# Altium footprint library con-samtec.PCBLIB: 805 footprints (part 9 of 55)
Each footprint in its own frame and in the unit in brackets; x right, y up, seen from the top. Pads: shape width x height; smd on the part's side, far side on the other; paste and mask are expansions set on the pad; w line width, h text height; cw(c..) or ccw(c..) is an arc to the next point about the centre after c.
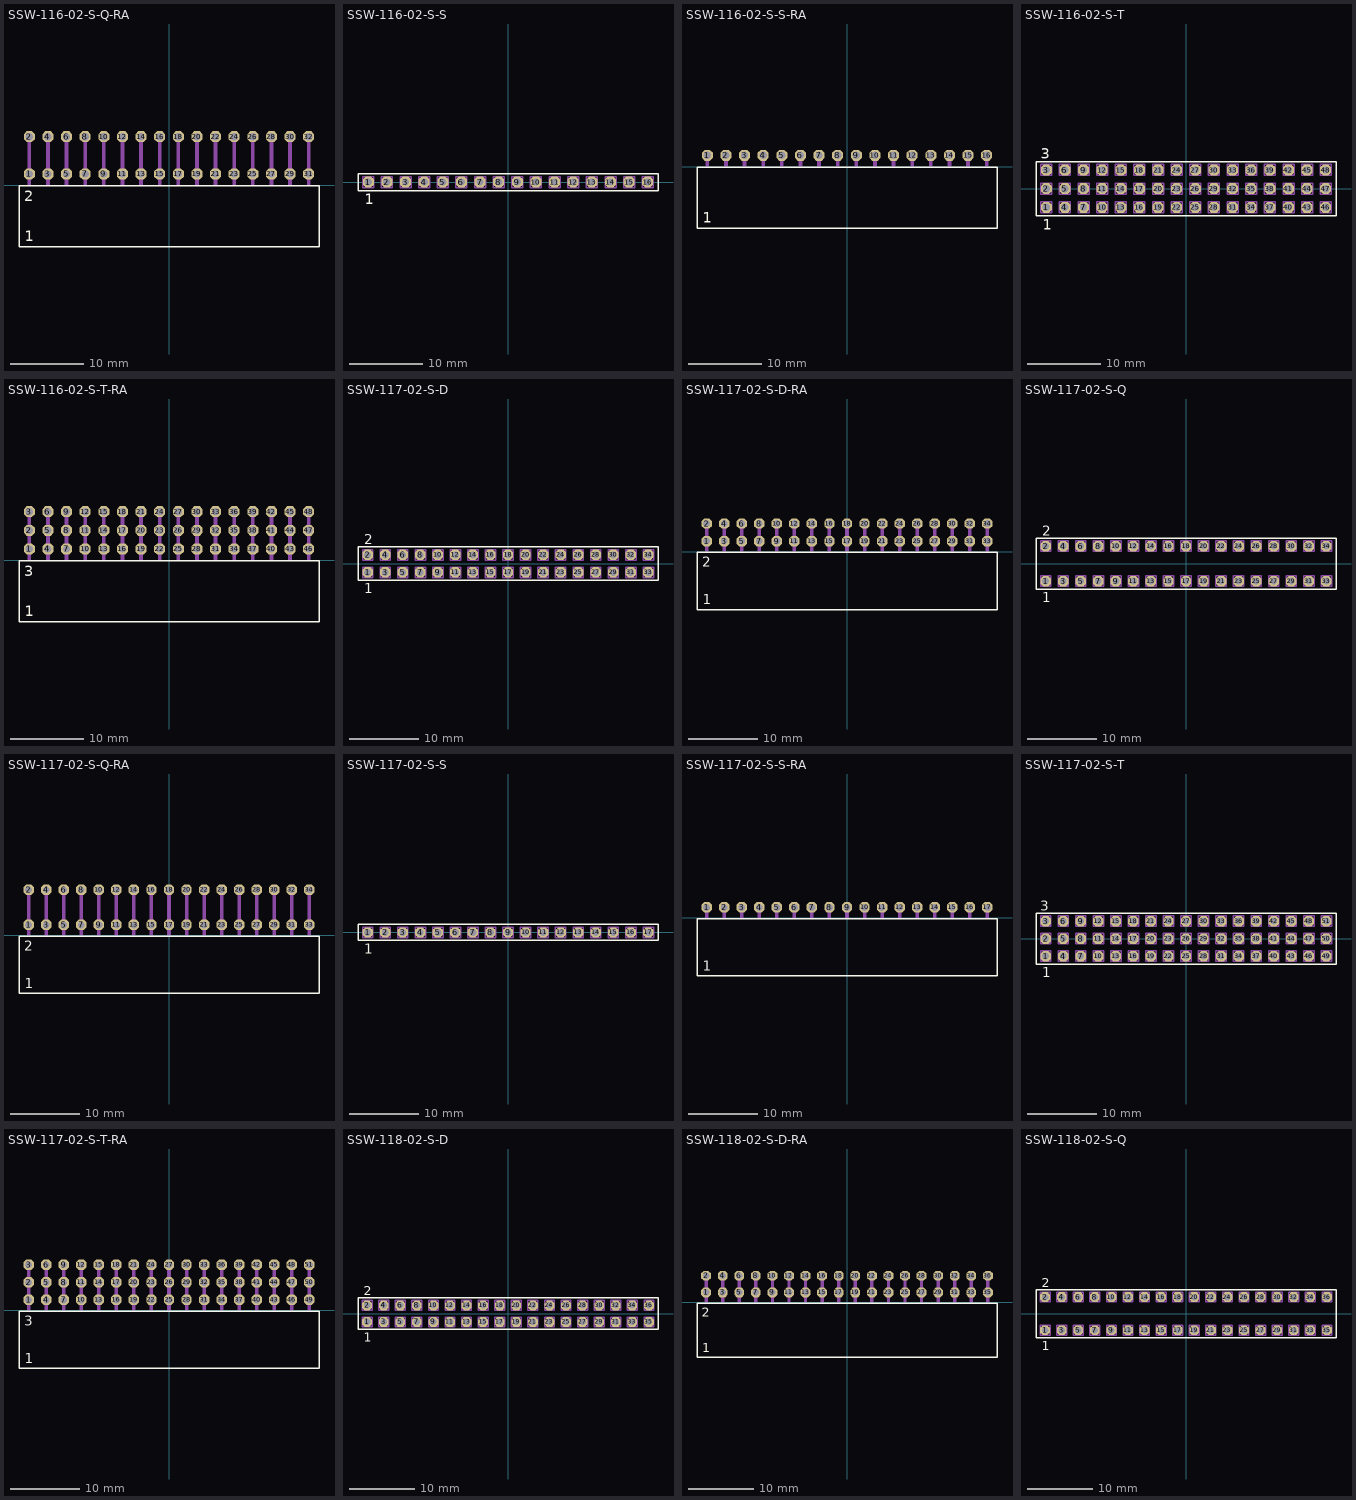
[diagram p8: the footprints below, top view; thin cyan lines are the x and y axes]

## SSW-116-02-S-Q-RA [mil]
pads (32):
  oct 59.06x59.06 hole 39.37: 1(-750,60) 2(-750,260) 3(-650,60) 4(-650,260) 5(-550,60) 6(-550,260) 7(-450,60) 8(-450,260) 9(-350,60) 10(-350,260) 11(-250,60) 12(-250,260) 13(-150,60) 14(-150,260) 15(-50,60) 16(-50,260) 17(50,60) 18(50,260) 19(150,60) 20(150,260) 21(250,60) 22(250,260) 23(350,60) 24(350,260) 25(450,60) 26(450,260) 27(550,60) 28(550,260) 29(650,60) 30(650,260) 31(750,60) 32(750,260)
Top Overlay:
  lines w8: -805.08,-330.55 805.08,-330.55 805.08,-4.17 -805.08,-4.17 -805.08,-330.55
  text "1" at -773.43,-301.18 h56.1
  text "2" at -776.38,-86.61 h56.1
Mechanical 16:
  rectangle: -760,0 -740,270
  rectangle: -660,0 -640,270
  rectangle: -560,0 -540,270
  rectangle: -460,0 -440,270
  rectangle: -360,0 -340,270
  rectangle: -260,0 -240,270
  rectangle: -160,0 -140,270
  rectangle: -60,0 -40,270
  rectangle: 40,0 60,270
  rectangle: 140,0 160,270
  rectangle: 240,0 260,270
  rectangle: 340,0 360,270
  rectangle: 440,0 460,270
  rectangle: 540,0 560,270
  rectangle: 640,0 660,270
  rectangle: 740,0 760,270

## SSW-116-02-S-S [mm]
pads (16):
  oct 1.5x1.5 hole 1: 1(-19.05,0) 2(-16.51,0) 3(-13.97,0) 4(-11.43,0) 5(-8.89,0) 6(-6.35,0) 7(-3.81,0) 8(-1.27,0) 9(1.27,0) 10(3.81,0) 11(6.35,0) 12(8.89,0) 13(11.43,0) 14(13.97,0) 15(16.51,0) 16(19.05,0)
Top Overlay:
  lines w0.203: -20.449,-1.155 20.449,-1.155 20.449,1.155 -20.449,1.155 -20.449,-1.155
  text "1" at -19.558,-3.048 h1.42
Mechanical 16:
  lines w0.203: -19.795,-0.745 -18.295,-0.745 -18.295,0.755 -19.795,0.755 -19.795,-0.745 ; -17.255,-0.745 -15.755,-0.745 -15.755,0.755 -17.255,0.755 -17.255,-0.745 ; -14.715,-0.745 -13.215,-0.745 -13.215,0.755 -14.715,0.755 -14.715,-0.745 ; -12.175,-0.745 -10.675,-0.745 -10.675,0.755 -12.175,0.755 -12.175,-0.745 ; -9.635,-0.745 -8.135,-0.745 -8.135,0.755 -9.635,0.755 -9.635,-0.745 ; -7.095,-0.745 -5.595,-0.745 -5.595,0.755 -7.095,0.755 -7.095,-0.745 ; -4.555,-0.745 -3.055,-0.745 -3.055,0.755 -4.555,0.755 -4.555,-0.745 ; -2.015,-0.745 -0.515,-0.745 -0.515,0.755 -2.015,0.755 -2.015,-0.745 ; 0.525,-0.745 2.025,-0.745 2.025,0.755 0.525,0.755 0.525,-0.745 ; 3.065,-0.745 4.565,-0.745 4.565,0.755 3.065,0.755 3.065,-0.745 ; 5.605,-0.745 7.105,-0.745 7.105,0.755 5.605,0.755 5.605,-0.745 ; 8.145,-0.745 9.645,-0.745 9.645,0.755 8.145,0.755 8.145,-0.745 ; 10.685,-0.745 12.185,-0.745 12.185,0.755 10.685,0.755 10.685,-0.745 ; 13.225,-0.745 14.725,-0.745 14.725,0.755 13.225,0.755 13.225,-0.745 ; 15.765,-0.745 17.265,-0.745 17.265,0.755 15.765,0.755 15.765,-0.745 ; 18.305,-0.745 19.805,-0.745 19.805,0.755 18.305,0.755 18.305,-0.745

## SSW-116-02-S-S-RA [mil]
pads (16):
  oct 59.06x59.06 hole 39.37: 1(-750,60) 2(-650,60) 3(-550,60) 4(-450,60) 5(-350,60) 6(-250,60) 7(-150,60) 8(-50,60) 9(50,60) 10(150,60) 11(250,60) 12(350,60) 13(450,60) 14(550,60) 15(650,60) 16(750,60)
Top Overlay:
  lines w8: -805.08,-330.55 805.08,-330.55 805.08,-4.17 -805.08,-4.17 -805.08,-330.55
  text "1" at -773.43,-301.18 h56.1
Mechanical 16:
  rectangle: -760,0 -740,70
  rectangle: -660,0 -640,70
  rectangle: -560,0 -540,70
  rectangle: -460,0 -440,70
  rectangle: -360,0 -340,70
  rectangle: -260,0 -240,70
  rectangle: -160,0 -140,70
  rectangle: -60,0 -40,70
  rectangle: 40,0 60,70
  rectangle: 140,0 160,70
  rectangle: 240,0 260,70
  rectangle: 340,0 360,70
  rectangle: 440,0 460,70
  rectangle: 540,0 560,70
  rectangle: 640,0 660,70
  rectangle: 740,0 760,70

## SSW-116-02-S-T [mm]
pads (48):
  oct 1.5x1.5 hole 1: 1(-19.05,-2.54) 2(-19.05,0) 3(-19.05,2.54) 4(-16.51,-2.54) 5(-16.51,0) 6(-16.51,2.54) 7(-13.97,-2.54) 8(-13.97,0) 9(-13.97,2.54) 10(-11.43,-2.54) 11(-11.43,0) 12(-11.43,2.54) 13(-8.89,-2.54) 14(-8.89,0) 15(-8.89,2.54) 16(-6.35,-2.54) 17(-6.35,0) 18(-6.35,2.54) 19(-3.81,-2.54) 20(-3.81,0) 21(-3.81,2.54) 22(-1.27,-2.54) 23(-1.27,0) 24(-1.27,2.54) 25(1.27,-2.54) 26(1.27,0) 27(1.27,2.54) 28(3.81,-2.54) 29(3.81,0) 30(3.81,2.54) 31(6.35,-2.54) 32(6.35,0) 33(6.35,2.54) 34(8.89,-2.54) 35(8.89,0) 36(8.89,2.54) 37(11.43,-2.54) 38(11.43,0) 39(11.43,2.54) 40(13.97,-2.54) 41(13.97,0) 42(13.97,2.54) 43(16.51,-2.54) 44(16.51,0) 45(16.51,2.54) 46(19.05,-2.54) 47(19.05,0) 48(19.05,2.54)
Top Overlay:
  lines w0.203: -20.449,-3.695 20.449,-3.695 20.449,3.695 -20.449,3.695 -20.449,-3.695
  text "1" at -19.558,-5.588 h1.42
  text "3" at -19.812,4.064 h1.42
Mechanical 16:
  drawing of 192 lines, arcs and shapes, not listed

## SSW-116-02-S-T-RA [mil]
pads (48):
  oct 59.06x59.06 hole 39.37: 1(-750,60) 2(-750,160) 3(-750,260) 4(-650,60) 5(-650,160) 6(-650,260) 7(-550,60) 8(-550,160) 9(-550,260) 10(-450,60) 11(-450,160) 12(-450,260) 13(-350,60) 14(-350,160) 15(-350,260) 16(-250,60) 17(-250,160) 18(-250,260) 19(-150,60) 20(-150,160) 21(-150,260) 22(-50,60) 23(-50,160) 24(-50,260) 25(50,60) 26(50,160) 27(50,260) 28(150,60) 29(150,160) 30(150,260) 31(250,60) 32(250,160) 33(250,260) 34(350,60) 35(350,160) 36(350,260) 37(450,60) 38(450,160) 39(450,260) 40(550,60) 41(550,160) 42(550,260) 43(650,60) 44(650,160) 45(650,260) 46(750,60) 47(750,160) 48(750,260)
Top Overlay:
  lines w8: -805.08,-330.55 805.08,-330.55 805.08,-4.17 -805.08,-4.17 -805.08,-330.55
  text "1" at -773.43,-301.18 h56.1
  text "3" at -776.38,-86.61 h56.1
Mechanical 16:
  rectangle: -760,0 -740,270
  rectangle: -660,0 -640,270
  rectangle: -560,0 -540,270
  rectangle: -460,0 -440,270
  rectangle: -360,0 -340,270
  rectangle: -260,0 -240,270
  rectangle: -160,0 -140,270
  rectangle: -60,0 -40,270
  rectangle: 40,0 60,270
  rectangle: 140,0 160,270
  rectangle: 240,0 260,270
  rectangle: 340,0 360,270
  rectangle: 440,0 460,270
  rectangle: 540,0 560,270
  rectangle: 640,0 660,270
  rectangle: 740,0 760,270

## SSW-117-02-S-D [mm]
pads (34):
  oct 1.5x1.5 hole 1: 1(-20.32,-1.27) 2(-20.32,1.27) 3(-17.78,-1.27) 4(-17.78,1.27) 5(-15.24,-1.27) 6(-15.24,1.27) 7(-12.7,-1.27) 8(-12.7,1.27) 9(-10.16,-1.27) 10(-10.16,1.27) 11(-7.62,-1.27) 12(-7.62,1.27) 13(-5.08,-1.27) 14(-5.08,1.27) 15(-2.54,-1.27) 16(-2.54,1.27) 17(0,-1.27) 18(0,1.27) 19(2.54,-1.27) 20(2.54,1.27) 21(5.08,-1.27) 22(5.08,1.27) 23(7.62,-1.27) 24(7.62,1.27) 25(10.16,-1.27) 26(10.16,1.27) 27(12.7,-1.27) 28(12.7,1.27) 29(15.24,-1.27) 30(15.24,1.27) 31(17.78,-1.27) 32(17.78,1.27) 33(20.32,-1.27) 34(20.32,1.27)
Top Overlay:
  lines w0.203: -21.719,-2.425 21.719,-2.425 21.719,2.425 -21.719,2.425 -21.719,-2.425
  text "1" at -20.828,-4.318 h1.42
  text "2" at -20.828,2.794 h1.42
Mechanical 16:
  lines w0.203: -21.065,-2.015 -19.565,-2.015 -19.565,-0.515 -21.065,-0.515 -21.065,-2.015 ; -21.065,0.525 -19.565,0.525 -19.565,2.025 -21.065,2.025 -21.065,0.525 ; -18.525,-2.015 -17.025,-2.015 -17.025,-0.515 -18.525,-0.515 -18.525,-2.015 ; -18.525,0.525 -17.025,0.525 -17.025,2.025 -18.525,2.025 -18.525,0.525 ; -15.985,-2.015 -14.485,-2.015 -14.485,-0.515 -15.985,-0.515 -15.985,-2.015 ; -15.985,0.525 -14.485,0.525 -14.485,2.025 -15.985,2.025 -15.985,0.525 ; -13.445,-2.015 -11.945,-2.015 -11.945,-0.515 -13.445,-0.515 -13.445,-2.015 ; -13.445,0.525 -11.945,0.525 -11.945,2.025 -13.445,2.025 -13.445,0.525 ; -10.905,-2.015 -9.405,-2.015 -9.405,-0.515 -10.905,-0.515 -10.905,-2.015 ; -10.905,0.525 -9.405,0.525 -9.405,2.025 -10.905,2.025 -10.905,0.525 ; -8.365,-2.015 -6.865,-2.015 -6.865,-0.515 -8.365,-0.515 -8.365,-2.015 ; -8.365,0.525 -6.865,0.525 -6.865,2.025 -8.365,2.025 -8.365,0.525 ; -5.825,-2.015 -4.325,-2.015 -4.325,-0.515 -5.825,-0.515 -5.825,-2.015 ; -5.825,0.525 -4.325,0.525 -4.325,2.025 -5.825,2.025 -5.825,0.525 ; -3.285,-2.015 -1.785,-2.015 -1.785,-0.515 -3.285,-0.515 -3.285,-2.015 ; -3.285,0.525 -1.785,0.525 -1.785,2.025 -3.285,2.025 -3.285,0.525 ; -0.745,-2.015 0.755,-2.015 0.755,-0.515 -0.745,-0.515 -0.745,-2.015 ; -0.745,0.525 0.755,0.525 0.755,2.025 -0.745,2.025 -0.745,0.525 ; 1.795,-2.015 3.295,-2.015 3.295,-0.515 1.795,-0.515 1.795,-2.015 ; 1.795,0.525 3.295,0.525 3.295,2.025 1.795,2.025 1.795,0.525 ; 4.335,-2.015 5.835,-2.015 5.835,-0.515 4.335,-0.515 4.335,-2.015 ; 4.335,0.525 5.835,0.525 5.835,2.025 4.335,2.025 4.335,0.525 ; 6.875,-2.015 8.375,-2.015 8.375,-0.515 6.875,-0.515 6.875,-2.015 ; 6.875,0.525 8.375,0.525 8.375,2.025 6.875,2.025 6.875,0.525 ; 9.415,-2.015 10.915,-2.015 10.915,-0.515 9.415,-0.515 9.415,-2.015 ; 9.415,0.525 10.915,0.525 10.915,2.025 9.415,2.025 9.415,0.525 ; 11.955,-2.015 13.455,-2.015 13.455,-0.515 11.955,-0.515 11.955,-2.015 ; 11.955,0.525 13.455,0.525 13.455,2.025 11.955,2.025 11.955,0.525 ; 14.495,-2.015 15.995,-2.015 15.995,-0.515 14.495,-0.515 14.495,-2.015 ; 14.495,0.525 15.995,0.525 15.995,2.025 14.495,2.025 14.495,0.525 ; 17.035,-2.015 18.535,-2.015 18.535,-0.515 17.035,-0.515 17.035,-2.015 ; 17.035,0.525 18.535,0.525 18.535,2.025 17.035,2.025 17.035,0.525 ; 19.575,-2.015 21.075,-2.015 21.075,-0.515 19.575,-0.515 19.575,-2.015 ; 19.575,0.525 21.075,0.525 21.075,2.025 19.575,2.025 19.575,0.525

## SSW-117-02-S-D-RA [mil]
pads (34):
  oct 59.06x59.06 hole 39.37: 1(-800,60) 2(-800,160) 3(-700,60) 4(-700,160) 5(-600,60) 6(-600,160) 7(-500,60) 8(-500,160) 9(-400,60) 10(-400,160) 11(-300,60) 12(-300,160) 13(-200,60) 14(-200,160) 15(-100,60) 16(-100,160) 17(0,60) 18(0,160) 19(100,60) 20(100,160) 21(200,60) 22(200,160) 23(300,60) 24(300,160) 25(400,60) 26(400,160) 27(500,60) 28(500,160) 29(600,60) 30(600,160) 31(700,60) 32(700,160) 33(800,60) 34(800,160)
Top Overlay:
  lines w8: -855.08,-330.55 855.08,-330.55 855.08,-4.17 -855.08,-4.17 -855.08,-330.55
  text "1" at -823.43,-301.18 h56.1
  text "2" at -826.38,-86.61 h56.1
Mechanical 16:
  rectangle: -810,0 -790,170
  rectangle: -710,0 -690,170
  rectangle: -610,0 -590,170
  rectangle: -510,0 -490,170
  rectangle: -410,0 -390,170
  rectangle: -310,0 -290,170
  rectangle: -210,0 -190,170
  rectangle: -110,0 -90,170
  rectangle: -10,0 10,170
  rectangle: 90,0 110,170
  rectangle: 190,0 210,170
  rectangle: 290,0 310,170
  rectangle: 390,0 410,170
  rectangle: 490,0 510,170
  rectangle: 590,0 610,170
  rectangle: 690,0 710,170
  rectangle: 790,0 810,170

## SSW-117-02-S-Q [mm]
pads (34):
  oct 1.5x1.5 hole 1: 1(-20.32,-2.54) 2(-20.32,2.54) 3(-17.78,-2.54) 4(-17.78,2.54) 5(-15.24,-2.54) 6(-15.24,2.54) 7(-12.7,-2.54) 8(-12.7,2.54) 9(-10.16,-2.54) 10(-10.16,2.54) 11(-7.62,-2.54) 12(-7.62,2.54) 13(-5.08,-2.54) 14(-5.08,2.54) 15(-2.54,-2.54) 16(-2.54,2.54) 17(0,-2.54) 18(0,2.54) 19(2.54,-2.54) 20(2.54,2.54) 21(5.08,-2.54) 22(5.08,2.54) 23(7.62,-2.54) 24(7.62,2.54) 25(10.16,-2.54) 26(10.16,2.54) 27(12.7,-2.54) 28(12.7,2.54) 29(15.24,-2.54) 30(15.24,2.54) 31(17.78,-2.54) 32(17.78,2.54) 33(20.32,-2.54) 34(20.32,2.54)
Top Overlay:
  lines w0.203: -21.719,-3.695 21.719,-3.695 21.719,3.695 -21.719,3.695 -21.719,-3.695
  text "1" at -20.828,-5.588 h1.42
  text "2" at -20.828,4.064 h1.42
Mechanical 16:
  lines w0.203: -21.065,-3.285 -19.565,-3.285 -19.565,-1.785 -21.065,-1.785 -21.065,-3.285 ; -21.065,1.795 -19.565,1.795 -19.565,3.295 -21.065,3.295 -21.065,1.795 ; -18.525,-3.285 -17.025,-3.285 -17.025,-1.785 -18.525,-1.785 -18.525,-3.285 ; -18.525,1.795 -17.025,1.795 -17.025,3.295 -18.525,3.295 -18.525,1.795 ; -15.985,-3.285 -14.485,-3.285 -14.485,-1.785 -15.985,-1.785 -15.985,-3.285 ; -15.985,1.795 -14.485,1.795 -14.485,3.295 -15.985,3.295 -15.985,1.795 ; -13.445,-3.285 -11.945,-3.285 -11.945,-1.785 -13.445,-1.785 -13.445,-3.285 ; -13.445,1.795 -11.945,1.795 -11.945,3.295 -13.445,3.295 -13.445,1.795 ; -10.905,-3.285 -9.405,-3.285 -9.405,-1.785 -10.905,-1.785 -10.905,-3.285 ; -10.905,1.795 -9.405,1.795 -9.405,3.295 -10.905,3.295 -10.905,1.795 ; -8.365,-3.285 -6.865,-3.285 -6.865,-1.785 -8.365,-1.785 -8.365,-3.285 ; -8.365,1.795 -6.865,1.795 -6.865,3.295 -8.365,3.295 -8.365,1.795 ; -5.825,-3.285 -4.325,-3.285 -4.325,-1.785 -5.825,-1.785 -5.825,-3.285 ; -5.825,1.795 -4.325,1.795 -4.325,3.295 -5.825,3.295 -5.825,1.795 ; -3.285,-3.285 -1.785,-3.285 -1.785,-1.785 -3.285,-1.785 -3.285,-3.285 ; -3.285,1.795 -1.785,1.795 -1.785,3.295 -3.285,3.295 -3.285,1.795 ; -0.745,-3.285 0.755,-3.285 0.755,-1.785 -0.745,-1.785 -0.745,-3.285 ; -0.745,1.795 0.755,1.795 0.755,3.295 -0.745,3.295 -0.745,1.795 ; 1.795,-3.285 3.295,-3.285 3.295,-1.785 1.795,-1.785 1.795,-3.285 ; 1.795,1.795 3.295,1.795 3.295,3.295 1.795,3.295 1.795,1.795 ; 4.335,-3.285 5.835,-3.285 5.835,-1.785 4.335,-1.785 4.335,-3.285 ; 4.335,1.795 5.835,1.795 5.835,3.295 4.335,3.295 4.335,1.795 ; 6.875,-3.285 8.375,-3.285 8.375,-1.785 6.875,-1.785 6.875,-3.285 ; 6.875,1.795 8.375,1.795 8.375,3.295 6.875,3.295 6.875,1.795 ; 9.415,-3.285 10.915,-3.285 10.915,-1.785 9.415,-1.785 9.415,-3.285 ; 9.415,1.795 10.915,1.795 10.915,3.295 9.415,3.295 9.415,1.795 ; 11.955,-3.285 13.455,-3.285 13.455,-1.785 11.955,-1.785 11.955,-3.285 ; 11.955,1.795 13.455,1.795 13.455,3.295 11.955,3.295 11.955,1.795 ; 14.495,-3.285 15.995,-3.285 15.995,-1.785 14.495,-1.785 14.495,-3.285 ; 14.495,1.795 15.995,1.795 15.995,3.295 14.495,3.295 14.495,1.795 ; 17.035,-3.285 18.535,-3.285 18.535,-1.785 17.035,-1.785 17.035,-3.285 ; 17.035,1.795 18.535,1.795 18.535,3.295 17.035,3.295 17.035,1.795 ; 19.575,-3.285 21.075,-3.285 21.075,-1.785 19.575,-1.785 19.575,-3.285 ; 19.575,1.795 21.075,1.795 21.075,3.295 19.575,3.295 19.575,1.795

## SSW-117-02-S-Q-RA [mil]
pads (34):
  oct 59.06x59.06 hole 39.37: 1(-800,60) 2(-800,260) 3(-700,60) 4(-700,260) 5(-600,60) 6(-600,260) 7(-500,60) 8(-500,260) 9(-400,60) 10(-400,260) 11(-300,60) 12(-300,260) 13(-200,60) 14(-200,260) 15(-100,60) 16(-100,260) 17(0,60) 18(0,260) 19(100,60) 20(100,260) 21(200,60) 22(200,260) 23(300,60) 24(300,260) 25(400,60) 26(400,260) 27(500,60) 28(500,260) 29(600,60) 30(600,260) 31(700,60) 32(700,260) 33(800,60) 34(800,260)
Top Overlay:
  lines w8: -855.08,-330.55 855.08,-330.55 855.08,-4.17 -855.08,-4.17 -855.08,-330.55
  text "1" at -823.43,-301.18 h56.1
  text "2" at -826.38,-86.61 h56.1
Mechanical 16:
  rectangle: -810,0 -790,270
  rectangle: -710,0 -690,270
  rectangle: -610,0 -590,270
  rectangle: -510,0 -490,270
  rectangle: -410,0 -390,270
  rectangle: -310,0 -290,270
  rectangle: -210,0 -190,270
  rectangle: -110,0 -90,270
  rectangle: -10,0 10,270
  rectangle: 90,0 110,270
  rectangle: 190,0 210,270
  rectangle: 290,0 310,270
  rectangle: 390,0 410,270
  rectangle: 490,0 510,270
  rectangle: 590,0 610,270
  rectangle: 690,0 710,270
  rectangle: 790,0 810,270

## SSW-117-02-S-S [mm]
pads (17):
  oct 1.5x1.5 hole 1: 1(-20.32,0) 2(-17.78,0) 3(-15.24,0) 4(-12.7,0) 5(-10.16,0) 6(-7.62,0) 7(-5.08,0) 8(-2.54,0) 9(0,0) 10(2.54,0) 11(5.08,0) 12(7.62,0) 13(10.16,0) 14(12.7,0) 15(15.24,0) 16(17.78,0) 17(20.32,0)
Top Overlay:
  lines w0.203: -21.719,-1.155 21.719,-1.155 21.719,1.155 -21.719,1.155 -21.719,-1.155
  text "1" at -20.828,-3.048 h1.42
Mechanical 16:
  lines w0.203: -21.065,-0.745 -19.565,-0.745 -19.565,0.755 -21.065,0.755 -21.065,-0.745 ; -18.525,-0.745 -17.025,-0.745 -17.025,0.755 -18.525,0.755 -18.525,-0.745 ; -15.985,-0.745 -14.485,-0.745 -14.485,0.755 -15.985,0.755 -15.985,-0.745 ; -13.445,-0.745 -11.945,-0.745 -11.945,0.755 -13.445,0.755 -13.445,-0.745 ; -10.905,-0.745 -9.405,-0.745 -9.405,0.755 -10.905,0.755 -10.905,-0.745 ; -8.365,-0.745 -6.865,-0.745 -6.865,0.755 -8.365,0.755 -8.365,-0.745 ; -5.825,-0.745 -4.325,-0.745 -4.325,0.755 -5.825,0.755 -5.825,-0.745 ; -3.285,-0.745 -1.785,-0.745 -1.785,0.755 -3.285,0.755 -3.285,-0.745 ; -0.745,-0.745 0.755,-0.745 0.755,0.755 -0.745,0.755 -0.745,-0.745 ; 1.795,-0.745 3.295,-0.745 3.295,0.755 1.795,0.755 1.795,-0.745 ; 4.335,-0.745 5.835,-0.745 5.835,0.755 4.335,0.755 4.335,-0.745 ; 6.875,-0.745 8.375,-0.745 8.375,0.755 6.875,0.755 6.875,-0.745 ; 9.415,-0.745 10.915,-0.745 10.915,0.755 9.415,0.755 9.415,-0.745 ; 11.955,-0.745 13.455,-0.745 13.455,0.755 11.955,0.755 11.955,-0.745 ; 14.495,-0.745 15.995,-0.745 15.995,0.755 14.495,0.755 14.495,-0.745 ; 17.035,-0.745 18.535,-0.745 18.535,0.755 17.035,0.755 17.035,-0.745 ; 19.575,-0.745 21.075,-0.745 21.075,0.755 19.575,0.755 19.575,-0.745

## SSW-117-02-S-S-RA [mil]
pads (17):
  oct 59.06x59.06 hole 39.37: 1(-800,60) 2(-700,60) 3(-600,60) 4(-500,60) 5(-400,60) 6(-300,60) 7(-200,60) 8(-100,60) 9(0,60) 10(100,60) 11(200,60) 12(300,60) 13(400,60) 14(500,60) 15(600,60) 16(700,60) 17(800,60)
Top Overlay:
  lines w8: -855.08,-330.55 855.08,-330.55 855.08,-4.17 -855.08,-4.17 -855.08,-330.55
  text "1" at -823.43,-301.18 h56.1
Mechanical 16:
  rectangle: -810,0 -790,70
  rectangle: -710,0 -690,70
  rectangle: -610,0 -590,70
  rectangle: -510,0 -490,70
  rectangle: -410,0 -390,70
  rectangle: -310,0 -290,70
  rectangle: -210,0 -190,70
  rectangle: -110,0 -90,70
  rectangle: -10,0 10,70
  rectangle: 90,0 110,70
  rectangle: 190,0 210,70
  rectangle: 290,0 310,70
  rectangle: 390,0 410,70
  rectangle: 490,0 510,70
  rectangle: 590,0 610,70
  rectangle: 690,0 710,70
  rectangle: 790,0 810,70

## SSW-117-02-S-T [mm]
pads (51):
  oct 1.5x1.5 hole 1: 1(-20.32,-2.54) 2(-20.32,0) 3(-20.32,2.54) 4(-17.78,-2.54) 5(-17.78,0) 6(-17.78,2.54) 7(-15.24,-2.54) 8(-15.24,0) 9(-15.24,2.54) 10(-12.7,-2.54) 11(-12.7,0) 12(-12.7,2.54) 13(-10.16,-2.54) 14(-10.16,0) 15(-10.16,2.54) 16(-7.62,-2.54) 17(-7.62,0) 18(-7.62,2.54) 19(-5.08,-2.54) 20(-5.08,0) 21(-5.08,2.54) 22(-2.54,-2.54) 23(-2.54,0) 24(-2.54,2.54) 25(0,-2.54) 26(0,0) 27(0,2.54) 28(2.54,-2.54) 29(2.54,0) 30(2.54,2.54) 31(5.08,-2.54) 32(5.08,0) 33(5.08,2.54) 34(7.62,-2.54) 35(7.62,0) 36(7.62,2.54) 37(10.16,-2.54) 38(10.16,0) 39(10.16,2.54) 40(12.7,-2.54) 41(12.7,0) 42(12.7,2.54) 43(15.24,-2.54) 44(15.24,0) 45(15.24,2.54) 46(17.78,-2.54) 47(17.78,0) 48(17.78,2.54) 49(20.32,-2.54) 50(20.32,0) 51(20.32,2.54)
Top Overlay:
  lines w0.203: -21.719,-3.695 21.719,-3.695 21.719,3.695 -21.719,3.695 -21.719,-3.695
  text "1" at -20.828,-5.588 h1.42
  text "3" at -21.082,4.064 h1.42
Mechanical 16:
  drawing of 204 lines, arcs and shapes, not listed

## SSW-117-02-S-T-RA [mil]
pads (51):
  oct 59.06x59.06 hole 39.37: 1(-800,60) 2(-800,160) 3(-800,260) 4(-700,60) 5(-700,160) 6(-700,260) 7(-600,60) 8(-600,160) 9(-600,260) 10(-500,60) 11(-500,160) 12(-500,260) 13(-400,60) 14(-400,160) 15(-400,260) 16(-300,60) 17(-300,160) 18(-300,260) 19(-200,60) 20(-200,160) 21(-200,260) 22(-100,60) 23(-100,160) 24(-100,260) 25(0,60) 26(0,160) 27(0,260) 28(100,60) 29(100,160) 30(100,260) 31(200,60) 32(200,160) 33(200,260) 34(300,60) 35(300,160) 36(300,260) 37(400,60) 38(400,160) 39(400,260) 40(500,60) 41(500,160) 42(500,260) 43(600,60) 44(600,160) 45(600,260) 46(700,60) 47(700,160) 48(700,260) 49(800,60) 50(800,160) 51(800,260)
Top Overlay:
  lines w8: -855.08,-330.55 855.08,-330.55 855.08,-4.17 -855.08,-4.17 -855.08,-330.55
  text "1" at -823.43,-301.18 h56.1
  text "3" at -826.38,-86.61 h56.1
Mechanical 16:
  rectangle: -810,0 -790,270
  rectangle: -710,0 -690,270
  rectangle: -610,0 -590,270
  rectangle: -510,0 -490,270
  rectangle: -410,0 -390,270
  rectangle: -310,0 -290,270
  rectangle: -210,0 -190,270
  rectangle: -110,0 -90,270
  rectangle: -10,0 10,270
  rectangle: 90,0 110,270
  rectangle: 190,0 210,270
  rectangle: 290,0 310,270
  rectangle: 390,0 410,270
  rectangle: 490,0 510,270
  rectangle: 590,0 610,270
  rectangle: 690,0 710,270
  rectangle: 790,0 810,270

## SSW-118-02-S-D [mm]
pads (36):
  oct 1.5x1.5 hole 1: 1(-21.59,-1.27) 2(-21.59,1.27) 3(-19.05,-1.27) 4(-19.05,1.27) 5(-16.51,-1.27) 6(-16.51,1.27) 7(-13.97,-1.27) 8(-13.97,1.27) 9(-11.43,-1.27) 10(-11.43,1.27) 11(-8.89,-1.27) 12(-8.89,1.27) 13(-6.35,-1.27) 14(-6.35,1.27) 15(-3.81,-1.27) 16(-3.81,1.27) 17(-1.27,-1.27) 18(-1.27,1.27) 19(1.27,-1.27) 20(1.27,1.27) 21(3.81,-1.27) 22(3.81,1.27) 23(6.35,-1.27) 24(6.35,1.27) 25(8.89,-1.27) 26(8.89,1.27) 27(11.43,-1.27) 28(11.43,1.27) 29(13.97,-1.27) 30(13.97,1.27) 31(16.51,-1.27) 32(16.51,1.27) 33(19.05,-1.27) 34(19.05,1.27) 35(21.59,-1.27) 36(21.59,1.27)
Top Overlay:
  lines w0.203: -22.989,-2.425 22.989,-2.425 22.989,2.425 -22.989,2.425 -22.989,-2.425
  text "1" at -22.098,-4.318 h1.42
  text "2" at -22.098,2.794 h1.42
Mechanical 16:
  lines w0.203: -22.335,-2.015 -20.835,-2.015 -20.835,-0.515 -22.335,-0.515 -22.335,-2.015 ; -22.335,0.525 -20.835,0.525 -20.835,2.025 -22.335,2.025 -22.335,0.525 ; -19.795,-2.015 -18.295,-2.015 -18.295,-0.515 -19.795,-0.515 -19.795,-2.015 ; -19.795,0.525 -18.295,0.525 -18.295,2.025 -19.795,2.025 -19.795,0.525 ; -17.255,-2.015 -15.755,-2.015 -15.755,-0.515 -17.255,-0.515 -17.255,-2.015 ; -17.255,0.525 -15.755,0.525 -15.755,2.025 -17.255,2.025 -17.255,0.525 ; -14.715,-2.015 -13.215,-2.015 -13.215,-0.515 -14.715,-0.515 -14.715,-2.015 ; -14.715,0.525 -13.215,0.525 -13.215,2.025 -14.715,2.025 -14.715,0.525 ; -12.175,-2.015 -10.675,-2.015 -10.675,-0.515 -12.175,-0.515 -12.175,-2.015 ; -12.175,0.525 -10.675,0.525 -10.675,2.025 -12.175,2.025 -12.175,0.525 ; -9.635,-2.015 -8.135,-2.015 -8.135,-0.515 -9.635,-0.515 -9.635,-2.015 ; -9.635,0.525 -8.135,0.525 -8.135,2.025 -9.635,2.025 -9.635,0.525 ; -7.095,-2.015 -5.595,-2.015 -5.595,-0.515 -7.095,-0.515 -7.095,-2.015 ; -7.095,0.525 -5.595,0.525 -5.595,2.025 -7.095,2.025 -7.095,0.525 ; -4.555,-2.015 -3.055,-2.015 -3.055,-0.515 -4.555,-0.515 -4.555,-2.015 ; -4.555,0.525 -3.055,0.525 -3.055,2.025 -4.555,2.025 -4.555,0.525 ; -2.015,-2.015 -0.515,-2.015 -0.515,-0.515 -2.015,-0.515 -2.015,-2.015 ; -2.015,0.525 -0.515,0.525 -0.515,2.025 -2.015,2.025 -2.015,0.525 ; 0.525,-2.015 2.025,-2.015 2.025,-0.515 0.525,-0.515 0.525,-2.015 ; 0.525,0.525 2.025,0.525 2.025,2.025 0.525,2.025 0.525,0.525 ; 3.065,-2.015 4.565,-2.015 4.565,-0.515 3.065,-0.515 3.065,-2.015 ; 3.065,0.525 4.565,0.525 4.565,2.025 3.065,2.025 3.065,0.525 ; 5.605,-2.015 7.105,-2.015 7.105,-0.515 5.605,-0.515 5.605,-2.015 ; 5.605,0.525 7.105,0.525 7.105,2.025 5.605,2.025 5.605,0.525 ; 8.145,-2.015 9.645,-2.015 9.645,-0.515 8.145,-0.515 8.145,-2.015 ; 8.145,0.525 9.645,0.525 9.645,2.025 8.145,2.025 8.145,0.525 ; 10.685,-2.015 12.185,-2.015 12.185,-0.515 10.685,-0.515 10.685,-2.015 ; 10.685,0.525 12.185,0.525 12.185,2.025 10.685,2.025 10.685,0.525 ; 13.225,-2.015 14.725,-2.015 14.725,-0.515 13.225,-0.515 13.225,-2.015 ; 13.225,0.525 14.725,0.525 14.725,2.025 13.225,2.025 13.225,0.525 ; 15.765,-2.015 17.265,-2.015 17.265,-0.515 15.765,-0.515 15.765,-2.015 ; 15.765,0.525 17.265,0.525 17.265,2.025 15.765,2.025 15.765,0.525 ; 18.305,-2.015 19.805,-2.015 19.805,-0.515 18.305,-0.515 18.305,-2.015 ; 18.305,0.525 19.805,0.525 19.805,2.025 18.305,2.025 18.305,0.525 ; 20.845,-2.015 22.345,-2.015 22.345,-0.515 20.845,-0.515 20.845,-2.015 ; 20.845,0.525 22.345,0.525 22.345,2.025 20.845,2.025 20.845,0.525

## SSW-118-02-S-D-RA [mil]
pads (36):
  oct 59.06x59.06 hole 39.37: 1(-850,60) 2(-850,160) 3(-750,60) 4(-750,160) 5(-650,60) 6(-650,160) 7(-550,60) 8(-550,160) 9(-450,60) 10(-450,160) 11(-350,60) 12(-350,160) 13(-250,60) 14(-250,160) 15(-150,60) 16(-150,160) 17(-50,60) 18(-50,160) 19(50,60) 20(50,160) 21(150,60) 22(150,160) 23(250,60) 24(250,160) 25(350,60) 26(350,160) 27(450,60) 28(450,160) 29(550,60) 30(550,160) 31(650,60) 32(650,160) 33(750,60) 34(750,160) 35(850,60) 36(850,160)
Top Overlay:
  lines w8: -905.08,-330.55 905.08,-330.55 905.08,-4.17 -905.08,-4.17 -905.08,-330.55
  text "1" at -873.43,-301.18 h56.1
  text "2" at -876.38,-86.61 h56.1
Mechanical 16:
  rectangle: -860,0 -840,170
  rectangle: -760,0 -740,170
  rectangle: -660,0 -640,170
  rectangle: -560,0 -540,170
  rectangle: -460,0 -440,170
  rectangle: -360,0 -340,170
  rectangle: -260,0 -240,170
  rectangle: -160,0 -140,170
  rectangle: -60,0 -40,170
  rectangle: 40,0 60,170
  rectangle: 140,0 160,170
  rectangle: 240,0 260,170
  rectangle: 340,0 360,170
  rectangle: 440,0 460,170
  rectangle: 540,0 560,170
  rectangle: 640,0 660,170
  rectangle: 740,0 760,170
  rectangle: 840,0 860,170

## SSW-118-02-S-Q [mm]
pads (36):
  oct 1.5x1.5 hole 1: 1(-21.59,-2.54) 2(-21.59,2.54) 3(-19.05,-2.54) 4(-19.05,2.54) 5(-16.51,-2.54) 6(-16.51,2.54) 7(-13.97,-2.54) 8(-13.97,2.54) 9(-11.43,-2.54) 10(-11.43,2.54) 11(-8.89,-2.54) 12(-8.89,2.54) 13(-6.35,-2.54) 14(-6.35,2.54) 15(-3.81,-2.54) 16(-3.81,2.54) 17(-1.27,-2.54) 18(-1.27,2.54) 19(1.27,-2.54) 20(1.27,2.54) 21(3.81,-2.54) 22(3.81,2.54) 23(6.35,-2.54) 24(6.35,2.54) 25(8.89,-2.54) 26(8.89,2.54) 27(11.43,-2.54) 28(11.43,2.54) 29(13.97,-2.54) 30(13.97,2.54) 31(16.51,-2.54) 32(16.51,2.54) 33(19.05,-2.54) 34(19.05,2.54) 35(21.59,-2.54) 36(21.59,2.54)
Top Overlay:
  lines w0.203: -22.989,-3.695 22.989,-3.695 22.989,3.695 -22.989,3.695 -22.989,-3.695
  text "1" at -22.098,-5.588 h1.42
  text "2" at -22.098,4.064 h1.42
Mechanical 16:
  lines w0.203: -22.335,-3.285 -20.835,-3.285 -20.835,-1.785 -22.335,-1.785 -22.335,-3.285 ; -22.335,1.795 -20.835,1.795 -20.835,3.295 -22.335,3.295 -22.335,1.795 ; -19.795,-3.285 -18.295,-3.285 -18.295,-1.785 -19.795,-1.785 -19.795,-3.285 ; -19.795,1.795 -18.295,1.795 -18.295,3.295 -19.795,3.295 -19.795,1.795 ; -17.255,-3.285 -15.755,-3.285 -15.755,-1.785 -17.255,-1.785 -17.255,-3.285 ; -17.255,1.795 -15.755,1.795 -15.755,3.295 -17.255,3.295 -17.255,1.795 ; -14.715,-3.285 -13.215,-3.285 -13.215,-1.785 -14.715,-1.785 -14.715,-3.285 ; -14.715,1.795 -13.215,1.795 -13.215,3.295 -14.715,3.295 -14.715,1.795 ; -12.175,-3.285 -10.675,-3.285 -10.675,-1.785 -12.175,-1.785 -12.175,-3.285 ; -12.175,1.795 -10.675,1.795 -10.675,3.295 -12.175,3.295 -12.175,1.795 ; -9.635,-3.285 -8.135,-3.285 -8.135,-1.785 -9.635,-1.785 -9.635,-3.285 ; -9.635,1.795 -8.135,1.795 -8.135,3.295 -9.635,3.295 -9.635,1.795 ; -7.095,-3.285 -5.595,-3.285 -5.595,-1.785 -7.095,-1.785 -7.095,-3.285 ; -7.095,1.795 -5.595,1.795 -5.595,3.295 -7.095,3.295 -7.095,1.795 ; -4.555,-3.285 -3.055,-3.285 -3.055,-1.785 -4.555,-1.785 -4.555,-3.285 ; -4.555,1.795 -3.055,1.795 -3.055,3.295 -4.555,3.295 -4.555,1.795 ; -2.015,-3.285 -0.515,-3.285 -0.515,-1.785 -2.015,-1.785 -2.015,-3.285 ; -2.015,1.795 -0.515,1.795 -0.515,3.295 -2.015,3.295 -2.015,1.795 ; 0.525,-3.285 2.025,-3.285 2.025,-1.785 0.525,-1.785 0.525,-3.285 ; 0.525,1.795 2.025,1.795 2.025,3.295 0.525,3.295 0.525,1.795 ; 3.065,-3.285 4.565,-3.285 4.565,-1.785 3.065,-1.785 3.065,-3.285 ; 3.065,1.795 4.565,1.795 4.565,3.295 3.065,3.295 3.065,1.795 ; 5.605,-3.285 7.105,-3.285 7.105,-1.785 5.605,-1.785 5.605,-3.285 ; 5.605,1.795 7.105,1.795 7.105,3.295 5.605,3.295 5.605,1.795 ; 8.145,-3.285 9.645,-3.285 9.645,-1.785 8.145,-1.785 8.145,-3.285 ; 8.145,1.795 9.645,1.795 9.645,3.295 8.145,3.295 8.145,1.795 ; 10.685,-3.285 12.185,-3.285 12.185,-1.785 10.685,-1.785 10.685,-3.285 ; 10.685,1.795 12.185,1.795 12.185,3.295 10.685,3.295 10.685,1.795 ; 13.225,-3.285 14.725,-3.285 14.725,-1.785 13.225,-1.785 13.225,-3.285 ; 13.225,1.795 14.725,1.795 14.725,3.295 13.225,3.295 13.225,1.795 ; 15.765,-3.285 17.265,-3.285 17.265,-1.785 15.765,-1.785 15.765,-3.285 ; 15.765,1.795 17.265,1.795 17.265,3.295 15.765,3.295 15.765,1.795 ; 18.305,-3.285 19.805,-3.285 19.805,-1.785 18.305,-1.785 18.305,-3.285 ; 18.305,1.795 19.805,1.795 19.805,3.295 18.305,3.295 18.305,1.795 ; 20.845,-3.285 22.345,-3.285 22.345,-1.785 20.845,-1.785 20.845,-3.285 ; 20.845,1.795 22.345,1.795 22.345,3.295 20.845,3.295 20.845,1.795